# Altium footprint library ICs And Semiconductors THD.PcbLib: 507 footprints (part 15 of 32)
Each footprint in its own frame and in the unit in brackets; x right, y up, seen from the top. Pads: shape width x height; smd on the part's side, far side on the other; paste and mask are expansions set on the pad; w line width, h text height; cw(c..) or ccw(c..) is an arc to the next point about the centre after c.
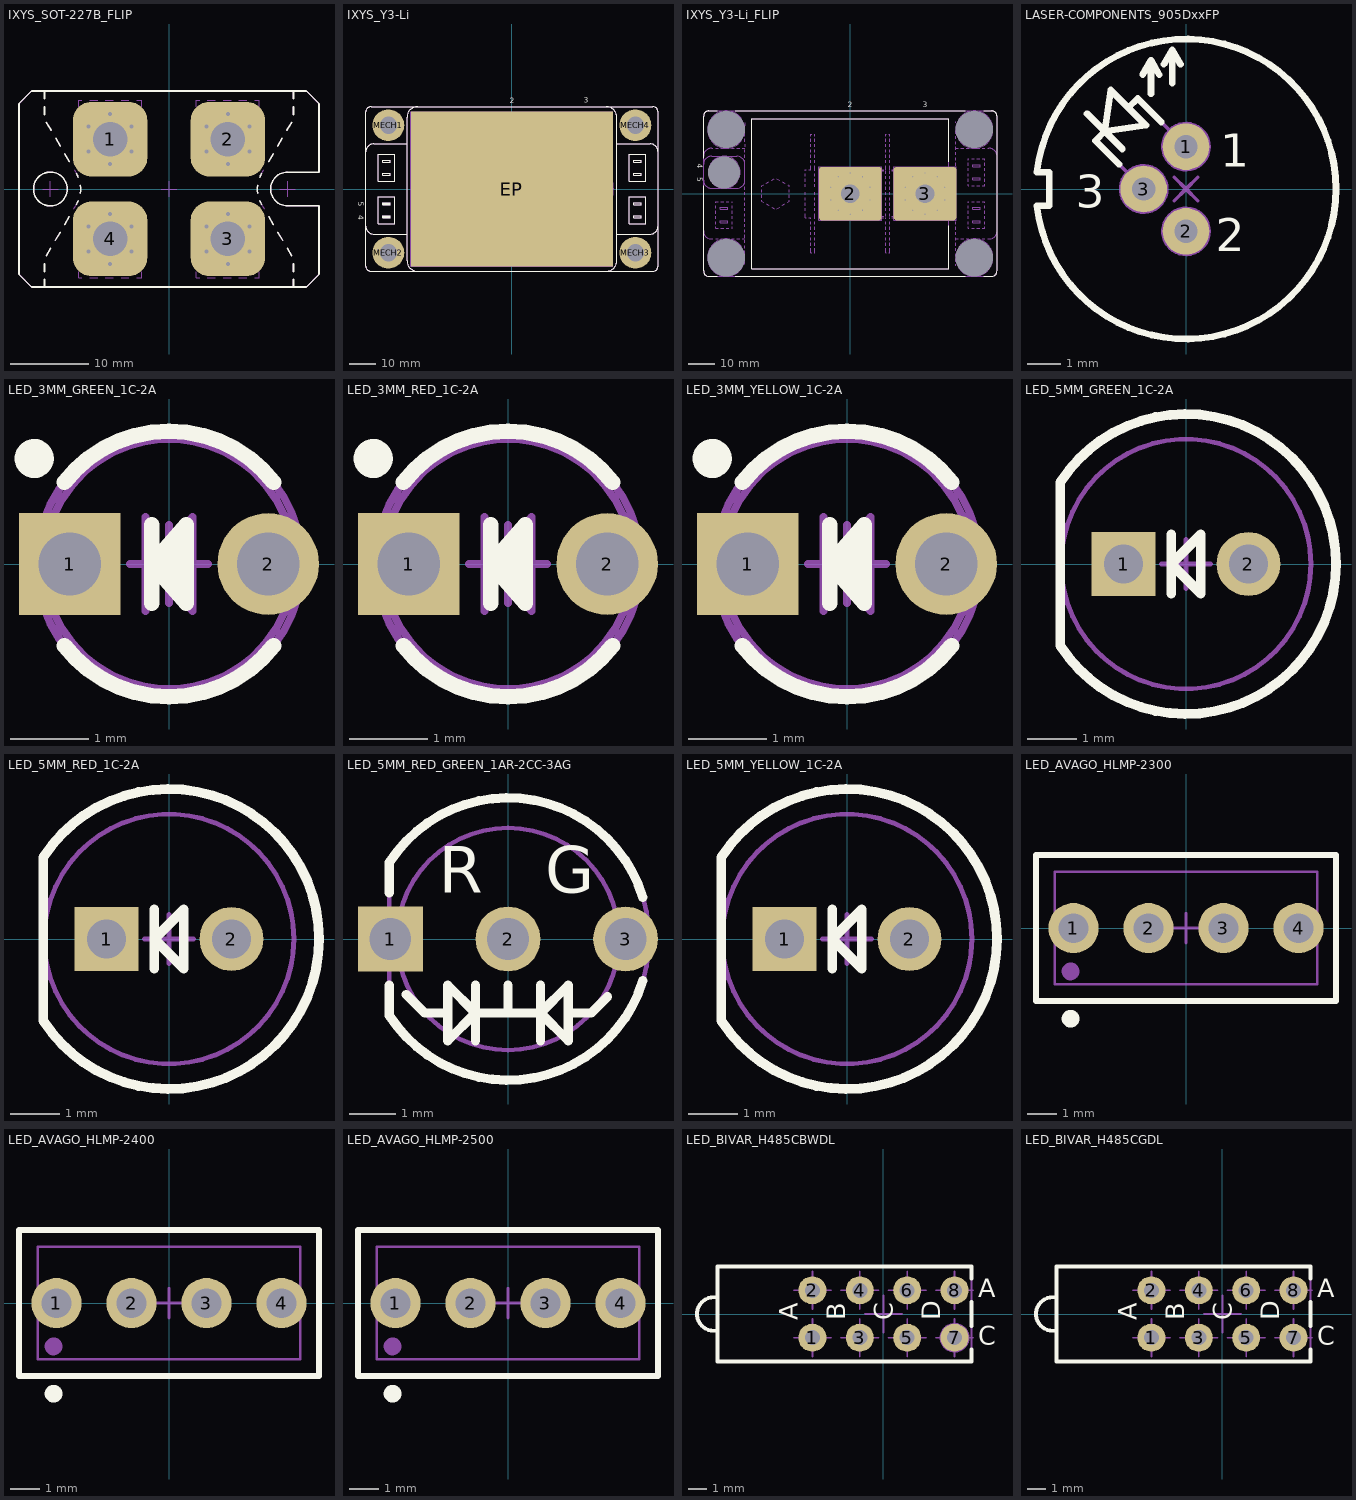
[diagram p14: the footprints below, top view; thin cyan lines are the x and y axes]

## IXYS_SOT-227B_FLIP [mm] "IXYS SOT-227B (Minibloc) Case, Body 38.01mm x 25.42mm, Screws on PCB Version"
height 12.22
pads (4):
  rrect50% 9.5x9.5 hole 4.4: 1(-7.5,6.35) 2(7.5,6.35) 3(7.5,-6.35) 4(-7.5,-6.35)
via 10.25,4.763 diameter 1 hole 0.5
via 7.5,3.175 diameter 1 hole 0.5
via 4.75,4.763 diameter 1 hole 0.5
via 4.75,7.938 diameter 1 hole 0.5
via 7.5,9.525 diameter 1 hole 0.5
via 10.25,7.938 diameter 1 hole 0.5
via -4.75,4.763 diameter 1 hole 0.5
via -7.5,3.175 diameter 1 hole 0.5
via -10.25,4.763 diameter 1 hole 0.5
via -10.25,7.938 diameter 1 hole 0.5
via -7.5,9.525 diameter 1 hole 0.5
via -4.75,7.938 diameter 1 hole 0.5
via 10.25,-7.938 diameter 1 hole 0.5
via 7.5,-9.525 diameter 1 hole 0.5
via 4.75,-7.938 diameter 1 hole 0.5
via 4.75,-4.763 diameter 1 hole 0.5
via 7.5,-3.175 diameter 1 hole 0.5
via 10.25,-4.763 diameter 1 hole 0.5
via -4.75,-7.938 diameter 1 hole 0.5
via -7.5,-9.525 diameter 1 hole 0.5
via -10.25,-7.938 diameter 1 hole 0.5
via -10.25,-4.763 diameter 1 hole 0.5
via -7.5,-3.175 diameter 1 hole 0.5
via -4.75,-4.763 diameter 1 hole 0.5
Top Overlay:
  circle w0.2: c-15.1,0 r2.15
  lines w0.2: -15.85,-11.521 -15.85,-12.479 ; -15.85,-10.521 -15.85,-9.521 ; -15.85,9.479 -15.85,10.479 ; -15.85,11.479 -15.85,12.479 ; -15.628,-8.521 -15.043,-7.521 ; -15.603,8.479 -15.018,7.479 ; -14.457,-6.521 -13.871,-5.521 ; -14.432,6.479 -13.847,5.479 ; -13.286,-4.521 -12.7,-3.521 ; -13.261,4.479 -12.676,3.479 ; -11.778,-1.945 ccw(c-15.1,0) -11.563,-1.521 ; -11.778,1.945 cw(c-15.1,0) -11.545,1.479 ; -11.285,-0.521 ccw(c-15.1,0) -11.28,0.479 ; 11.28,0.479 ccw(c15.1,0) 11.285,-0.521 ; 11.545,1.479 cw(c15.1,0) 11.778,1.945 ; 11.563,-1.521 ccw(c15.1,0) 11.778,-1.945 ; 12.676,3.479 13.261,4.479 ; 12.7,-3.521 13.286,-4.521 ; 13.847,5.479 14.432,6.479 ; 13.871,-5.521 14.457,-6.521 ; 15.018,7.479 15.603,8.479 ; 15.043,-7.521 15.628,-8.521 ; 15.85,-11.521 15.85,-12.479 ; 15.85,-10.521 15.85,-9.521 ; 15.85,9.479 15.85,10.479 ; 15.85,11.479 15.85,12.479 ; -15.85,-12.479 15.85,-12.479 ; -15.85,-12.479 -17.5,-12.479 -19.1,-10.879 -19.1,10.879 -17.5,12.479 -15.85,12.479 ; -15.85,12.479 15.85,12.479 ; 15.1,-2.15 cw(c15.1,0) 15.1,2.15 ; 15.1,-2.15 19.1,-2.15 ; 15.1,-2.15 19.1,-2.15 ; 15.1,2.15 19.1,2.15 ; 15.1,2.15 19.1,2.15 ; 15.85,-12.479 17.5,-12.479 19.1,-10.879 19.1,-2.15 ; 15.85,12.479 17.5,12.479 19.1,10.879 19.1,2.15
Notvisible:
  lines w0.1: -15.1,0 -16.1,0 -15.1,0 ; -15.1,0 -14.1,0 -15.1,0 ; -15.1,0 -15.1,1 -15.1,0 ; -15.1,0 -15.1,-1 -15.1,0 ; -7.5,-6.35 -8.5,-6.35 -7.5,-6.35 ; -7.5,-6.35 -6.5,-6.35 -7.5,-6.35 ; -7.5,-6.35 -7.5,-5.35 -7.5,-6.35 ; -7.5,-6.35 -7.5,-7.35 -7.5,-6.35 ; -7.5,6.35 -8.5,6.35 -7.5,6.35 ; -7.5,6.35 -6.5,6.35 -7.5,6.35 ; -7.5,6.35 -7.5,7.35 -7.5,6.35 ; -7.5,6.35 -7.5,5.35 -7.5,6.35 ; 0,0 -1,0 0,0 ; 0,0 1,0 0,0 ; 0,0 0,1 0,0 ; 0,0 0,-1 0,0 ; 7.5,-6.35 6.5,-6.35 7.5,-6.35 ; 7.5,-6.35 8.5,-6.35 7.5,-6.35 ; 7.5,-6.35 7.5,-5.35 7.5,-6.35 ; 7.5,-6.35 7.5,-7.35 7.5,-6.35 ; 7.5,6.35 6.5,6.35 7.5,6.35 ; 7.5,6.35 8.5,6.35 7.5,6.35 ; 7.5,6.35 7.5,7.35 7.5,6.35 ; 7.5,6.35 7.5,5.35 7.5,6.35 ; 15.1,0 14.1,0 15.1,0 ; 15.1,0 16.1,0 15.1,0 ; 15.1,0 15.1,1 15.1,0 ; 15.1,0 15.1,-1 15.1,0
Mechanical 14:
  circle w0.1: c-7.5,6.35 r2.2
  circle w0.1: c7.5,6.35 r2.2
  circle w0.1: c7.5,-6.35 r2.2
  circle w0.1: c-7.5,-6.35 r2.2
  circle w0.1: c-15.1,0 r2.15
  lines w0.1: -15.85,-11.521 -15.85,-12.479 ; -15.85,-10.521 -15.85,-9.521 ; -15.85,9.479 -15.85,10.479 ; -15.85,11.479 -15.85,12.479 ; -15.628,-8.521 -15.043,-7.521 ; -15.603,8.479 -15.018,7.479 ; -14.457,-6.521 -13.871,-5.521 ; -14.432,6.479 -13.847,5.479 ; -13.286,-4.521 -12.7,-3.521 ; -13.261,4.479 -12.676,3.479 ; -12.115,-2.521 -11.778,-1.945 ccw(c-15.1,0) -11.563,-1.521 ; -12.09,2.479 -11.778,1.945 cw(c-15.1,0) -11.545,1.479 ; -11.5,-10.521 -11.5,-11.314 -11.1,-11.314 ; -11.5,-9.521 -11.5,-8.521 ; -11.5,-7.521 -11.5,-6.521 ; -11.5,-5.521 -11.5,-4.521 ; -11.5,-3.521 -11.5,-3.342 ; -11.5,3.479 -11.5,3.342 -10.637,2.479 ; -11.5,4.479 -11.5,5.479 ; -11.5,6.479 -11.5,7.479 ; -11.5,8.479 -11.5,9.479 ; -11.5,10.479 -11.5,11.314 -11.1,11.314 ; -11.285,-0.521 ccw(c-15.1,0) -11.28,0.479 ; -10.1,-11.314 -9.1,-11.314 ; -10.1,11.314 -9.1,11.314 ; -10,1.842 -9.1,1.842 ; -8.1,-11.314 -7.1,-11.314 ; -8.1,1.842 -7.1,1.842 ; -8.1,11.314 -7.1,11.314 ; -6.1,-11.314 -5.1,-11.314 ; -6.1,1.842 -5.1,1.842 ; -6.1,11.314 -5.1,11.314 ; -5.1,-1.842 -6.1,-1.842 -5,-1.842 ; -4.363,2.479 -3.5,3.342 -3.5,3.479 ; -4.1,-11.314 -3.5,-11.314 -3.5,-10.521 ; -4.1,11.314 -3.5,11.314 -3.5,10.479 ; -3.5,-9.521 -3.5,-8.521 ; -3.5,-7.521 -3.5,-6.521 ; -3.5,-5.521 -3.5,-4.521 ; -3.5,-3.521 -3.5,-3.342 ; -3.5,4.479 -3.5,5.479 ; -3.5,6.479 -3.5,7.479 ; -3.5,8.479 -3.5,9.479 ; 3.5,-10.521 3.5,-11.314 3.9,-11.314 ; 3.5,-9.521 3.5,-8.521 ; 3.5,-7.521 3.5,-6.521 ; 3.5,-5.521 3.5,-4.521 ; 3.5,-3.521 3.5,-3.342 4.321,-2.521 ; 3.5,3.479 3.5,3.342 4.363,2.479 ; 3.5,4.479 3.5,5.479 ; 3.5,6.479 3.5,7.479 ; 3.5,8.479 3.5,9.479 ; 3.5,10.479 3.5,11.314 3.9,11.314 ; 4.9,-11.314 5.9,-11.314 ; 4.9,11.314 5.9,11.314 ; 5,-1.842 5.9,-1.842 ; 5,1.842 5.9,1.842 ; 6.9,-11.314 7.9,-11.314 ; 6.9,-1.842 7.9,-1.842 ; 6.9,1.842 7.9,1.842 ; 6.9,11.314 7.9,11.314 ; 8.9,-11.314 9.9,-11.314 ; 8.9,-1.842 9.9,-1.842 ; 8.9,1.842 9.9,1.842 ; 8.9,11.314 9.9,11.314 ; 10.637,2.479 11.5,3.342 11.5,3.479 ; 10.679,-2.521 11.5,-3.342 11.5,-3.521 ; 10.9,-11.314 11.5,-11.314 11.5,-10.521 ; 10.9,11.314 11.5,11.314 11.5,10.479 ; 11.28,0.479 ccw(c15.1,0) 11.285,-0.521 ; 11.5,-9.521 11.5,-8.521 ; 11.5,-7.521 11.5,-6.521 ; 11.5,-5.521 11.5,-4.521 ; 11.5,4.479 11.5,5.479 ; 11.5,6.479 11.5,7.479 ; 11.5,8.479 11.5,9.479 ; 11.545,1.479 cw(c15.1,0) 11.778,1.945 12.09,2.479 ; 11.563,-1.521 ccw(c15.1,0) 11.778,-1.945 12.115,-2.521 ; 12.676,3.479 13.261,4.479 ; 12.7,-3.521 13.286,-4.521 ; 13.847,5.479 14.432,6.479 ; 13.871,-5.521 14.457,-6.521 ; 15.018,7.479 15.603,8.479 ; 15.043,-7.521 15.628,-8.521 ; 15.85,-11.521 15.85,-12.479 ; 15.85,-10.521 15.85,-9.521 ; 15.85,9.479 15.85,10.479 ; 15.85,11.479 15.85,12.479 ; -15.85,-12.479 -17.5,-12.479 -19.1,-10.879 -19.1,10.879 -17.5,12.479 -15.85,12.479 ; -15.85,-12.479 15.85,-12.479 ; -15.85,12.479 15.85,12.479 ; -11.5,-3.342 -10.679,-2.521 -11.5,-3.342 ; -3.5,-3.342 -4.321,-2.521 -3.5,-3.342 ; 15.1,-2.15 cw(c15.1,0) 15.1,2.15 ; 15.1,-2.15 19.1,-2.15 ; 15.1,-2.15 19.1,-2.15 ; 15.1,2.15 19.1,2.15 ; 15.1,2.15 19.1,2.15 ; 15.85,-12.479 17.5,-12.479 19.1,-10.879 19.1,-2.15 ; 15.85,12.479 17.5,12.479 19.1,10.879 19.1,2.15 ; -10,-1.842 -9.1,-1.842 -10,-1.842 ; -8.1,-1.842 -7.1,-1.842 -8.1,-1.842
3D body "IXYS_SOT-227B_FLIP_Part2.stp": height 10.24, standoff -4.69, extent -11.5,-10.365 11.5,10.365
3D body "IXYS_SOT-227B_FLIP.stp": height 12.02, standoff -4.69, extent -19.05,-12.625 19.05,12.625

## IXYS_Y3-Li [mm] "IXYS Y3-Li Case, Body 110mm x 62mm, Screws on PCB Version"
height 31
pads (5):
  rect 76x58.2 smd: EP(0,0)
  round 12 hole 6.5: MECH1(-46.5,24) MECH2(-46.5,-24) MECH3(46.5,-24) MECH4(46.5,24)
Top Overlay:
  lines w0.2: -55,-14 ccw(c-52,-14) -52,-17 -39.5,-17 ; -55,14 cw(c-52,14) -52,17 -39.5,17 ; -48.65,-10.8 -45.85,-10.8 ; -48.65,-10.7 -45.85,-10.7 ; -48.65,-10.6 -45.85,-10.6 ; -48.65,-10.5 -45.85,-10.5 ; -48.65,-10.4 -45.85,-10.4 ; -48.65,-10.3 -45.85,-10.3 ; -48.65,-10.2 -45.85,-10.2 ; -48.65,-5.8 -45.85,-5.8 ; -48.65,-5.7 -45.85,-5.7 ; -48.65,-5.6 -45.85,-5.6 ; -48.65,-5.5 -45.85,-5.5 ; -48.65,-5.4 -45.85,-5.4 ; -48.65,-5.3 -45.85,-5.3 ; -48.65,-5.2 -45.85,-5.2 ; -35.5,-31 cw(c-35.5,-27) -39.5,-27 -39.5,27 cw(c-35.5,27) -35.5,31 ; 35.5,-31 ccw(c35.5,-27) 39.5,-27 39.5,27 ccw(c35.5,27) 35.5,31 ; 39.5,-17 52,-17 ccw(c52,-14) 55,-14 ; 39.5,17 52,17 cw(c52,14) 55,14 ; -55,-29 ccw(c-53,-29) -53,-31 53,-31 ccw(c53,-29) 55,-29 55,29 ccw(c53,29) 53,31 -53,31 ccw(c-53,29) -55,29 -55,-29 ; -50.35,-13 -50.35,-3 -44.15,-3 -44.15,-13 -50.35,-13 ; -50.35,3 -44.15,3 -44.15,13 -50.35,13 -50.35,3 ; -48.65,-10.9 -48.65,-10.1 -45.85,-10.1 -45.85,-10.9 -48.65,-10.9 ; -48.65,-5.9 -48.65,-5.1 -45.85,-5.1 -45.85,-5.9 -48.65,-5.9 ; -48.65,5.1 -48.65,5.9 -45.85,5.9 -45.85,5.1 -48.65,5.1 ; -48.65,10.1 -48.65,10.9 -45.85,10.9 -45.85,10.1 -48.65,10.1 ; 44.15,-13 50.35,-13 50.35,-3 44.15,-3 44.15,-13 ; 44.15,3 50.35,3 50.35,13 44.15,13 44.15,3 ; 45.85,-10.9 48.65,-10.9 48.65,-10.1 45.85,-10.1 45.85,-10.9 ; 45.85,-5.9 48.65,-5.9 48.65,-5.1 45.85,-5.1 45.85,-5.9 ; 45.85,5.1 48.65,5.1 48.65,5.9 45.85,5.9 45.85,5.1 ; 45.85,10.1 48.65,10.1 48.65,10.9 45.85,10.9 45.85,10.1
  text "4" at -57.95,-9.846 h2
  text "3" at 27.096,32.45 h2
  text "2" at -0.904,32.35 h2
  text "5" at -57.95,-4.846 h2
Notvisible:
  lines w0.1: -47.75,-10.5 -47.25,-10.5 ; -47.75,-5.5 -47.25,-5.5 ; -47.25,-11 -47.25,-10.5 ; -47.25,-10 -47.25,-10.5 ; -47.25,-6 -47.25,-5.5 ; -47.25,-5 -47.25,-5.5 ; -47,-24 -46.5,-24 ; -47,24 -46.5,24 ; -46.75,-10.5 -47.25,-10.5 ; -46.75,-5.5 -47.25,-5.5 ; -46.5,-24.5 -46.5,-24 ; -46.5,-23.5 -46.5,-24 ; -46.5,23.5 -46.5,24 ; -46.5,24.5 -46.5,24 ; -46,-24 -46.5,-24 ; -46,24 -46.5,24 ; -0.5,0 0,0 ; 0,-0.5 0,0 ; 0,0.5 0,0 ; 0.5,0 0,0 ; 27.5,0 28,0 ; 28,-0.5 28,0 ; 28,0.5 28,0 ; 28.5,0 28,0 ; 46,-24 46.5,-24 ; 46,24 46.5,24 ; 46.5,-24.5 46.5,-24 ; 46.5,-23.5 46.5,-24 ; 46.5,23.5 46.5,24 ; 46.5,24.5 46.5,24 ; 47,-24 46.5,-24 ; 47,24 46.5,24 ; -38,-29.1 -38,29.1 38,29.1 38,-29.1 -38,-29.1
Mechanical 14:
  circle w0.1: c-28,0 r3
  circle w0.1: c46.5,-24 r3.25
  circle w0.1: c46.5,24 r3.25
  circle w0.1: c-46.5,24 r3.25
  circle w0.1: c-46.5,-24 r3.288
  lines w0.1: -55,-14 ccw(c-52,-14) -52,-17 -39.5,-17 ; -55,14 cw(c-52,14) -52,17 -39.5,17 ; -48.65,-10.8 -45.85,-10.8 ; -48.65,-10.7 -45.85,-10.7 ; -48.65,-10.6 -45.85,-10.6 ; -48.65,-10.5 -45.85,-10.5 ; -48.65,-10.4 -45.85,-10.4 ; -48.65,-10.3 -45.85,-10.3 ; -48.65,-10.2 -45.85,-10.2 ; -48.65,-5.8 -45.85,-5.8 ; -48.65,-5.7 -45.85,-5.7 ; -48.65,-5.6 -45.85,-5.6 ; -48.65,-5.5 -45.85,-5.5 ; -48.65,-5.4 -45.85,-5.4 ; -48.65,-5.3 -45.85,-5.3 ; -48.65,-5.2 -45.85,-5.2 ; -35.5,-31 cw(c-35.5,-27) -39.5,-27 -39.5,27 cw(c-35.5,27) -35.5,31 ; 11.1,-8.5 11.1,-9 13.25,-9 13.25,-22.25 14.75,-22.25 14.75,-9 16.9,-9 16.9,-8.5 ; 11.1,8.5 11.1,9 13.25,9 13.25,22.25 14.75,22.25 14.75,9 16.9,9 16.9,8.5 ; 35.5,-31 ccw(c35.5,-27) 39.5,-27 39.5,27 ccw(c35.5,27) 35.5,31 ; 39.5,-17 52,-17 ccw(c52,-14) 55,-14 ; 39.5,17 52,17 cw(c52,14) 55,14 ; -55,-29 ccw(c-53,-29) -53,-31 53,-31 ccw(c53,-29) 55,-29 55,29 ccw(c53,29) 53,31 -53,31 ccw(c-53,29) -55,29 -55,-29 ; -50.35,-13 -50.35,-3 -44.15,-3 -44.15,-13 -50.35,-13 ; -50.35,3 -44.15,3 -44.15,13 -50.35,13 -50.35,3 ; -48.65,-10.9 -48.65,-10.1 -45.85,-10.1 -45.85,-10.9 -48.65,-10.9 ; -48.65,-5.9 -48.65,-5.1 -45.85,-5.1 -45.85,-5.9 -48.65,-5.9 ; -48.65,5.1 -48.65,5.9 -45.85,5.9 -45.85,5.1 -48.65,5.1 ; -48.65,10.1 -48.65,10.9 -45.85,10.9 -45.85,10.1 -48.65,10.1 ; -33.1,-2.944 -33.1,2.944 -28,5.889 -22.9,2.944 -22.9,-2.944 -28,-5.889 -33.1,-2.944 ; -16.9,-9 -14.75,-9 -14.75,-22.25 -13.25,-22.25 -13.25,22.25 -14.75,22.25 -14.75,9 -16.9,9 -16.9,-9 ; -8.25,-8.5 cw(c8.813,0) -8.25,8.5 13.25,8.5 13.25,-8.5 -8.25,-8.5 ; -0.5,-3.25 cw(c-0.5,0) -0.5,3.25 0.5,3.25 cw(c0.5,0) 0.5,-3.25 -0.5,-3.25 ; 14.75,-8.5 14.75,8.5 36.25,8.5 cw(c19.188,0) 36.25,-8.5 14.75,-8.5 ; 27.5,-3.25 cw(c27.5,0) 27.5,3.25 28.5,3.25 cw(c28.5,0) 28.5,-3.25 27.5,-3.25 ; 44.15,-13 50.35,-13 50.35,-3 44.15,-3 44.15,-13 ; 44.15,3 50.35,3 50.35,13 44.15,13 44.15,3 ; 45.85,-10.9 48.65,-10.9 48.65,-10.1 45.85,-10.1 45.85,-10.9 ; 45.85,-5.9 48.65,-5.9 48.65,-5.1 45.85,-5.1 45.85,-5.9 ; 45.85,5.1 48.65,5.1 48.65,5.9 45.85,5.9 45.85,5.1 ; 45.85,10.1 48.65,10.1 48.65,10.9 45.85,10.9 45.85,10.1
  text "4" at -57.95,-9.846 h2
  text "5" at -57.95,-4.846 h2
3D body "IXYS_Y3-Li.stp": height 31, standoff 0, extent -55,-31 55,31

## IXYS_Y3-Li_FLIP [mm] "IXYS Y3-Li Case, Body 110mm x 62mm"
height 31
pads (7):
  rrect10% 23.5x20 hole 7: 2(0,0) 3(28,0)
  round 1 hole 14 unplated mask+6.5: MECH1(-46.5,24) MECH2(-46.5,-24) MECH3(46.5,-24) MECH4(46.5,24)
  round 1 hole 12 unplated mask+5.5: MECH5(-47.25,8)
via 4.555,6.27 diameter 1 hole 0.5
via 7.371,2.395 diameter 1 hole 0.5
via 7.371,-2.395 diameter 1 hole 0.5
via 4.555,-6.27 diameter 1 hole 0.5
via -4.555,-6.27 diameter 1 hole 0.5
via -7.371,-2.395 diameter 1 hole 0.5
via -7.371,2.395 diameter 1 hole 0.5
via -4.555,6.27 diameter 1 hole 0.5
via 0,7.75 diameter 1 hole 0.5
via 0,-7.75 diameter 1 hole 0.5
via 23.445,6.27 diameter 1 hole 0.5
via 28,7.75 diameter 1 hole 0.5
via 32.555,6.27 diameter 1 hole 0.5
via 35.371,2.395 diameter 1 hole 0.5
via 35.371,-2.395 diameter 1 hole 0.5
via 32.555,-6.27 diameter 1 hole 0.5
via 28,-7.75 diameter 1 hole 0.5
via 23.445,-6.27 diameter 1 hole 0.5
via 20.629,-2.395 diameter 1 hole 0.5
via 20.629,2.395 diameter 1 hole 0.5
Top Overlay:
  lines w0.2: -55,3 -55,-29 ccw(c-53,-29) -53,-31 -49.941,-31 ; -55,13.332 -55,29 cw(c-53,29) -53,31 -49.941,31 ; -43.059,-31 43.059,-31 ; -43.059,31 43.059,31 ; 37,-12 37,-28.1 -37,-28.1 -37,28.1 37,28.1 37,12 ; 49.941,-31 53,-31 ccw(c53,-29) 55,-29 55,29 ccw(c53,29) 53,31 49.941,31
  text "2" at -0.904,32.35 h2
  text "3" at 27.096,32.45 h2
  text "4" at -57.45,11.154 h2
  text "5" at -57.45,6.154 h2
Notvisible:
  circle w0.1: c-46.5,24 r7
  circle w0.1: c-47.25,8 r6
  circle w0.1: c46.5,-24 r7
  circle w0.1: c-46.5,-24 r7
  circle w0.1: c46.5,24 r7
  circle w0.1: c28,0 r7.75
  circle w0.1: c0,0 r7.75
  circle w0.1: c28,0 r3.5
  circle w0.1: c0,0 r3.5
  lines w0.1: -47.75,5.5 -47.25,5.5 ; -47.75,8 -47.25,8 ; -47.75,10.5 -47.25,10.5 ; -47.25,5 -47.25,5.5 ; -47.25,6 -47.25,5.5 ; -47.25,7.5 -47.25,8 ; -47.25,8.5 -47.25,8 ; -47.25,10 -47.25,10.5 ; -47.25,11 -47.25,10.5 ; -47,-24 -46.5,-24 ; -47,24 -46.5,24 ; -46.75,5.5 -47.25,5.5 ; -46.75,8 -47.25,8 ; -46.75,10.5 -47.25,10.5 ; -46.5,-24.5 -46.5,-24 ; -46.5,-23.5 -46.5,-24 ; -46.5,23.5 -46.5,24 ; -46.5,24.5 -46.5,24 ; -46,-24 -46.5,-24 ; -46,24 -46.5,24 ; -39.5,4.5 -39.5,11 ccw(c-42.5,11) -42.5,14 -52,14 ccw(c-52,11) -55,11 -55,5 ccw(c-52,5) -52,2 -42.5,2 ccw(c-42.5,5) -39.5,5 ; -7.371,-2.395 0,0 ; -7.371,2.395 0,0 ; -4.555,-6.27 0,0 ; -4.555,6.27 0,0 ; -0.354,-0.354 0,0 ; -0.354,0.354 0,0 ; 0,-7.75 0,0 ; 0,7.75 0,0 ; 0.354,-0.354 0,0 ; 0.354,0.354 0,0 ; 4.555,-6.27 0,0 ; 4.555,6.27 0,0 ; 7.371,-2.395 0,0 ; 7.371,2.395 0,0 ; 20.629,-2.395 28,0 ; 20.629,2.395 28,0 ; 23.445,-6.27 28,0 ; 23.445,6.27 28,0 ; 27.646,-0.354 28,0 ; 27.646,0.354 28,0 ; 28,-7.75 28,0 ; 28,7.75 28,0 ; 28.354,-0.354 28,0 ; 28.354,0.354 28,0 ; 32.555,-6.27 28,0 ; 32.555,6.27 28,0 ; 35.371,-2.395 28,0 ; 35.371,2.395 28,0 ; 46,-24 46.5,-24 ; 46,24 46.5,24 ; 46.5,-24.5 46.5,-24 ; 46.5,-23.5 46.5,-24 ; 46.5,23.5 46.5,24 ; 46.5,24.5 46.5,24 ; 47,-24 46.5,-24 ; 47,24 46.5,24 ; -11.75,-10 11.75,-10 11.75,10 -11.75,10 -11.75,-10 ; 16.25,-10 16.25,10 39.75,10 39.75,-10 16.25,-10
Mechanical 14:
  drawing of 385 lines, arcs and shapes, not listed
  text "4" at -57.45,11.154 h2
  text "5" at -57.45,6.154 h2
3D body "IXYS_Y3-Li_FLIP.stp": height 31, standoff 0, extent -55,-31 55,31

## LASER-COMPONENTS_905DxxFP [mm] "905nm Fiber Pigtailed Pulsed Laser Diode 905 XX FP-Series"
height 36
pads (3):
  round 1.4 hole 0.7: 1(0,1.27) 2(0,-1.27) 3(-1.27,0)
Top Overlay:
  lines w0.2: -2.968,2.261 -1.908,1.201 ; -2.012,0.742 -2.72,1.45 -2.438,1.731 ; -1.731,2.438 -1.45,2.72 -0.742,2.012 ; -1.3,3.427 -1.05,3.86 ; -1.05,2.86 -1.05,3.86 ; -0.8,3.427 -1.05,3.86 ; -0.664,3.738 -0.414,4.171 ; -0.414,3.171 -0.414,4.171 ; -0.164,3.738 -0.414,4.171 ; -2.438,1.731 -1.201,1.908 -2.261,2.968 -2.438,1.731 ; -4.472,-0.5 ccw(c0,0) -4.472,0.5 -4.1,0.5 -4.1,-0.5 -4.472,-0.5
  text "1" at 1.027,0.67 h1
  text "3" at -3.304,-0.568 h1
  text "2" at 0.886,-1.87 h1
Notvisible:
  circle w0.1: c0,1.27 r0.7
  circle w0.1: c0,1.27 r0.35
  circle w0.1: c-1.27,0 r0.7
  circle w0.1: c-1.27,0 r0.35
  circle w0.1: c0,-1.27 r0.7
  circle w0.1: c0,-1.27 r0.35
  lines w0.1: -1.77,0 -1.27,0 ; -1.27,-0.5 -1.27,0 ; -1.27,0.5 -1.27,0 ; -0.77,0 -1.27,0 ; -0.5,-1.27 0,-1.27 ; -0.5,1.27 0,1.27 ; -0.354,-0.354 0,0 ; -0.354,0.354 0,0 ; 0,-1.77 0,-1.27 ; 0,-0.77 0,-1.27 ; 0,0.77 0,1.27 ; 0,1.77 0,1.27 ; 0.354,-0.354 0,0 ; 0.354,0.354 0,0 ; 0.5,-1.27 0,-1.27 ; 0.5,1.27 0,1.27
Mechanical 14:
  lines w0.1: -2.968,2.261 -1.908,1.201 ; -1.731,2.438 -1.45,2.72 0,1.27 ; -1.3,3.427 -1.05,3.86 ; -1.27,0 -2.72,1.45 -2.438,1.731 ; -1.05,2.86 -1.05,3.86 ; -0.8,3.427 -1.05,3.86 ; -0.664,3.738 -0.414,4.171 ; -0.414,3.171 -0.414,4.171 ; -0.164,3.738 -0.414,4.171 ; -2.438,1.731 -1.201,1.908 -2.261,2.968 -2.438,1.731 ; -4.472,-0.5 ccw(c0,0) -4.472,0.5 -4.1,0.5 -4.1,-0.5 -4.472,-0.5
  text "1" at 1.027,0.67 h1
  text "3" at -3.304,-0.568 h1
  text "2" at 0.886,-1.87 h1
3D body "LASER-COMPONENTS_905DxxFP.stp": height 41, standoff -3.8, extent -4.472,-4.495 4.5,4.495

## LED_3MM_GREEN_1C-2A [mm] "LED, Green, Body Dia. 3.43 mm, Pin spacing 2.54mm"
height 6.35
pads (2):
  rect 1.3x1.3 hole 0.8: 1(-1.27,0)
  round 1.3 hole 0.8: 2(1.27,0)
Top Overlay:
  circle w0.25: c-1.725,1.35 r0.125
  lines w0.2: -1.339,-1.048 ccw(c0,0) 1.339,-1.048 ; -1.339,1.048 cw(c0,0) 1.339,1.048 ; -0.22,-0.5 -0.22,0.5 ; 0.22,-0.4 -0.22,0 ; 0.22,-0.3 -0.22,0 ; 0.22,-0.2 -0.22,0 ; 0.22,-0.1 -0.22,0 ; 0.22,0 -0.22,0 ; 0.22,0.1 -0.22,0 ; 0.22,0.2 -0.22,0 ; 0.22,0.3 -0.22,0 ; 0.22,0.4 -0.22,0 ; -0.22,0 0.22,0.5 0.22,-0.5 -0.22,0
Notvisible:
  lines w0.1: -1.77,0 -1.27,0 ; -1.27,-0.5 -1.27,0 ; -1.27,0.5 -1.27,0 ; -0.77,0 -1.27,0 ; -0.5,0 0,0 ; 0,-0.5 0,0 ; 0,0.5 0,0 ; 0.5,0 0,0 ; 0.77,0 1.27,0 ; 1.27,-0.5 1.27,0 ; 1.27,0.5 1.27,0 ; 1.77,0 1.27,0
Mechanical 14:
  circle w0.1: c0,0 r1.7
  circle w0.1: c0,0 r1.6
  lines w0.1: -0.3,-0.6 -0.3,0.6 ; 0.3,0 -0.3,0 ; -0.3,0 0.3,0.6 0.3,-0.6 -0.3,0
3D body "LED_3MM_GREEN_v.stp": height 9.85, standoff -3.5, extent -1.715,-1.715 1.715,1.715

## LED_3MM_RED_1C-2A [mm] "LED, Red, Body Dia. 3.43 mm, Pin spacing 2.54mm"
height 6.35
pads (2):
  rect 1.3x1.3 hole 0.8: 1(-1.27,0)
  round 1.3 hole 0.8: 2(1.27,0)
Top Overlay:
  circle w0.25: c-1.725,1.35 r0.125
  lines w0.2: -1.339,-1.048 ccw(c0,0) 1.339,-1.048 ; -1.339,1.048 cw(c0,0) 1.339,1.048 ; -0.22,-0.5 -0.22,0.5 ; 0.22,-0.4 -0.22,0 ; 0.22,-0.3 -0.22,0 ; 0.22,-0.2 -0.22,0 ; 0.22,-0.1 -0.22,0 ; 0.22,0 -0.22,0 ; 0.22,0.1 -0.22,0 ; 0.22,0.2 -0.22,0 ; 0.22,0.3 -0.22,0 ; 0.22,0.4 -0.22,0 ; -0.22,0 0.22,-0.5 0.22,0.5 -0.22,0
Notvisible:
  lines w0.1: -1.77,0 -1.27,0 ; -1.27,-0.5 -1.27,0 ; -1.27,0.5 -1.27,0 ; -0.77,0 -1.27,0 ; -0.5,0 0,0 ; 0,-0.5 0,0 ; 0,0.5 0,0 ; 0.5,0 0,0 ; 0.77,0 1.27,0 ; 1.27,-0.5 1.27,0 ; 1.27,0.5 1.27,0 ; 1.77,0 1.27,0
Mechanical 14:
  circle w0.1: c0,0 r1.6
  circle w0.1: c0,0 r1.7
  lines w0.1: -0.3,-0.6 -0.3,0.6 ; 0.3,0 -0.3,0 ; -0.3,0 0.3,-0.6 0.3,0.6 -0.3,0
3D body "LED_3MM_RED_v.stp": height 9.85, standoff -3.5, extent -1.715,-1.715 1.715,1.715

## LED_3MM_YELLOW_1C-2A [mm] "LED, Red, Body Dia. 3.43 mm, Pin spacing 2.54mm"
height 6.35
pads (2):
  rect 1.3x1.3 hole 0.8: 1(-1.27,0)
  round 1.3 hole 0.8: 2(1.27,0)
Top Overlay:
  circle w0.25: c-1.725,1.35 r0.125
  lines w0.2: -1.339,-1.048 ccw(c0,0) 1.339,-1.048 ; -1.339,1.048 cw(c0,0) 1.339,1.048 ; -0.22,-0.5 -0.22,0.5 ; 0.22,-0.4 -0.22,0 ; 0.22,-0.3 -0.22,0 ; 0.22,-0.2 -0.22,0 ; 0.22,-0.1 -0.22,0 ; 0.22,0 -0.22,0 ; 0.22,0.1 -0.22,0 ; 0.22,0.2 -0.22,0 ; 0.22,0.3 -0.22,0 ; 0.22,0.4 -0.22,0 ; -0.22,0 0.22,-0.5 0.22,0.5 -0.22,0
Notvisible:
  lines w0.1: -1.77,0 -1.27,0 ; -1.27,-0.5 -1.27,0 ; -1.27,0.5 -1.27,0 ; -0.77,0 -1.27,0 ; -0.5,0 0,0 ; 0,-0.5 0,0 ; 0,0.5 0,0 ; 0.5,0 0,0 ; 0.77,0 1.27,0 ; 1.27,-0.5 1.27,0 ; 1.27,0.5 1.27,0 ; 1.77,0 1.27,0
Mechanical 14:
  circle w0.1: c0,0 r1.6
  circle w0.1: c0,0 r1.7
  lines w0.1: -0.3,-0.6 -0.3,0.6 ; 0.3,0 -0.3,0 ; -0.3,0 0.3,-0.6 0.3,0.6 -0.3,0
3D body "LED_3MM_YELLOW_v.stp": height 9.85, standoff -3.5, extent -1.715,-1.715 1.715,1.715

## LED_5MM_GREEN_1C-2A [mm] "LED, Green, Body Dia. 5.08mm, Pin spacing 2.54mm"
height 9.19
pads (2):
  rect 1.3x1.3 hole 0.8: 1(-1.27,0)
  round 1.3 hole 0.8: 2(1.27,0)
Top Overlay:
  lines w0.2: -0.3,-0.6 -0.3,0.6 ; -2.558,-1.661 ccw(c0,0) -2.558,1.661 -2.558,-1.661 ; -0.3,0 0.3,-0.6 0.3,0.6 -0.3,0
Notvisible:
  lines w0.1: -0.5,0 0,0 ; 0,-0.5 0,0 ; 0,0.5 0,0 ; 0.5,0 0,0
Mechanical 14:
  circle w0.1: c0,0 r2.54
  lines w0.1: -0.3,-0.6 -0.3,0.6 ; -2.529,-1.706 ccw(c0,0) -2.529,1.706 -2.529,-1.706 ; -0.3,0 0.3,0.6 0.3,-0.6 -0.3,0
3D body "LED_5MM_GREEN_v.stp": height 14.32, standoff -3.5, extent -2.54,-3.048 3.05,3.048

## LED_5MM_RED_1C-2A [mm] "LED, Red, Body Dia. 5.08mm, Pin spacing 2.54mm"
height 9.19
pads (2):
  rect 1.3x1.3 hole 0.8: 1(-1.27,0)
  round 1.3 hole 0.8: 2(1.27,0)
Top Overlay:
  lines w0.2: -0.3,-0.6 -0.3,0.6 ; -2.558,-1.661 ccw(c0,0) -2.558,1.661 -2.558,-1.661 ; -0.3,0 0.3,-0.6 0.3,0.6 -0.3,0
Notvisible:
  lines w0.1: -0.5,0 0,0 ; 0,-0.5 0,0 ; 0,0.5 0,0 ; 0.5,0 0,0
Mechanical 14:
  circle w0.1: c0,0 r2.54
  lines w0.1: -0.3,-0.6 -0.3,0.6 ; -2.529,-1.706 ccw(c0,0) -2.529,1.706 -2.529,-1.706 ; -0.3,0 0.3,0.6 0.3,-0.6 -0.3,0
3D body "LED_5MM_RED_v.stp": height 14.32, standoff -3.5, extent -2.54,-3.048 3.05,3.048

## LED_5MM_RED_GREEN_1AR-2CC-3AG [mm] "Bicolor Red/Green  LED 1 Anode Red 2 Com Cathode 3 Anode Green, Body Dia. 5.08mm, Pin spacing 2.54mm"
height 12.4
pads (3):
  rect 1.4x1.4 hole 0.9: 1(-2.54,0)
  round 1.4 hole 0.9: 2(0,0) 3(2.54,0)
Top Overlay:
  lines w0.2: -2.563,-1 -2.563,-1.653 ccw(c0,0) 2.913,-0.904 ; -2.563,1 -2.563,1.653 cw(c0,0) 2.913,0.904 ; -2.2,-1.2 -1.8,-1.6 -1.3,-1.6 ; -0.7,-2.2 -0.7,-1 ; 0,-1.6 0,-1 ; 0.7,-2.2 0.7,-1 ; 1.3,-1.6 1.8,-1.6 2.15,-1.25 ; -0.7,-1.6 -1.3,-2.2 -1.3,-1 -0.7,-1.6 ; -0.7,-1.6 0.7,-1.6 ; 0.7,-1.6 1.3,-1 1.3,-2.2 0.7,-1.6
  text "R" at -1.5,1 h1
  text "G" at 0.8,1 h1
Mechanical 14:
  lines w0.1: -1.8,-1.6 -1.3,-1.6 ; -0.7,-2.2 -0.7,-1 ; 0,-1.6 0,-1 ; 0.7,-2.2 0.7,-1 ; 1.3,-1.6 1.8,-1.6 ; -0.7,-1.6 0.7,-1.6 ; -0.7,-1.6 -1.3,-1 -1.3,-2.2 -0.7,-1.6 ; 0.7,-1.6 1.3,-2.2 1.3,-1 0.7,-1.6 ; -2.563,-1.653 ccw(c0,0) 3.05,0 ccw(c0,0) -2.563,1.653 -2.563,0 -2.563,-1.653 ; -2.4,0 cw(c0,0) 2.4,0 cw(c0,0) -2.4,0
3D body "LED_OSRAM_LU5351-JM-1.stp": height 12.4, standoff -3.6, extent -2.94,-2.95 2.95,2.95

## LED_5MM_YELLOW_1C-2A [mm] "LED, Yellow, Body Dia. 5.08mm, Pin spacing 2.54mm"
height 9.19
pads (2):
  rect 1.3x1.3 hole 0.8: 1(-1.27,0)
  round 1.3 hole 0.8: 2(1.27,0)
Top Overlay:
  lines w0.2: -0.3,-0.6 -0.3,0.6 ; -2.558,-1.661 ccw(c0,0) -2.558,1.661 -2.558,-1.661 ; -0.3,0 0.3,0.6 0.3,-0.6 -0.3,0
Notvisible:
  lines w0.1: -0.5,0 0,0 ; 0,-0.5 0,0 ; 0,0.5 0,0 ; 0.5,0 0,0
Mechanical 14:
  circle w0.1: c0,0 r2.54
  lines w0.1: -0.3,-0.6 -0.3,0.6 ; -2.529,-1.706 ccw(c0,0) -2.529,1.706 -2.529,-1.706 ; -0.3,0 0.3,0.6 0.3,-0.6 -0.3,0
3D body "LED_5MM_YELLOW_v.stp": height 14.32, standoff -3.5, extent -2.54,-3.048 3.05,3.048

## LED_AVAGO_HLMP-2300 [mm] "10.16x 4.953mm HER LED Bar Module (2 LEDs)"
height 6.22
pads (4):
  round 1.7 hole 1: 1(-3.81,0) 2(-1.27,0) 3(1.27,0) 4(3.81,0)
Top Overlay:
  circle w0.3: c-3.91,-3.07 r0.15
  lines w0.2: -5.08,-2.477 -5.08,2.477 5.08,2.477 5.08,-2.477 -5.08,-2.477
Notvisible:
  lines w0.1: -4.31,0 -3.81,0 ; -3.81,-0.5 -3.81,0 ; -3.81,0.5 -3.81,0 ; -3.31,0 -3.81,0 ; -1.77,0 -1.27,0 ; -1.27,-0.5 -1.27,0 ; -1.27,0.5 -1.27,0 ; -0.77,0 -1.27,0 ; -0.5,0 0,0 ; 0,-0.5 0,0 ; 0,0.5 0,0 ; 0.5,0 0,0 ; 0.77,0 1.27,0 ; 1.27,-0.5 1.27,0 ; 1.27,0.5 1.27,0 ; 1.77,0 1.27,0 ; 3.31,0 3.81,0 ; 3.81,-0.5 3.81,0 ; 3.81,0.5 3.81,0 ; 4.31,0 3.81,0
Mechanical 14:
  circle w0.3: c-3.91,-1.47 r0.15
  lines w0.1: -4.445,-1.905 -4.445,1.905 ; -4.445,-1.905 4.445,-1.905 ; -4.445,-1.905 -4.445,1.905 ; -4.445,-1.905 4.445,-1.905 ; -4.445,1.905 4.445,1.905 ; -4.445,1.905 4.445,1.905 ; 4.445,-1.905 4.445,1.905 ; 4.445,-1.905 4.445,1.905 ; -5.08,-2.477 -5.08,2.477 5.08,2.477 5.08,-2.477 -5.08,-2.477
3D body "LED_AVAGO_HLMP-2300.stp": height 6.22, standoff -3.18, extent -5.08,-2.476 5.08,2.477

## LED_AVAGO_HLMP-2400 [mm] "10.16x 4.953mm Yellow LED Bar Module (2 LEDs)"
height 6.22
pads (4):
  round 1.7 hole 1: 1(-3.81,0) 2(-1.27,0) 3(1.27,0) 4(3.81,0)
Top Overlay:
  circle w0.3: c-3.91,-3.07 r0.15
  lines w0.2: -5.08,-2.477 -5.08,2.477 5.08,2.477 5.08,-2.477 -5.08,-2.477
Notvisible:
  lines w0.1: -4.31,0 -3.81,0 ; -3.81,-0.5 -3.81,0 ; -3.81,0.5 -3.81,0 ; -3.31,0 -3.81,0 ; -1.77,0 -1.27,0 ; -1.27,-0.5 -1.27,0 ; -1.27,0.5 -1.27,0 ; -0.77,0 -1.27,0 ; -0.5,0 0,0 ; 0,-0.5 0,0 ; 0,0.5 0,0 ; 0.5,0 0,0 ; 0.77,0 1.27,0 ; 1.27,-0.5 1.27,0 ; 1.27,0.5 1.27,0 ; 1.77,0 1.27,0 ; 3.31,0 3.81,0 ; 3.81,-0.5 3.81,0 ; 3.81,0.5 3.81,0 ; 4.31,0 3.81,0
Mechanical 14:
  circle w0.3: c-3.91,-1.47 r0.15
  lines w0.1: -4.445,-1.905 -4.445,1.905 ; -4.445,-1.905 4.445,-1.905 ; -4.445,-1.905 -4.445,1.905 ; -4.445,-1.905 4.445,-1.905 ; -4.445,1.905 4.445,1.905 ; -4.445,1.905 4.445,1.905 ; 4.445,-1.905 4.445,1.905 ; 4.445,-1.905 4.445,1.905 ; -5.08,-2.477 -5.08,2.477 5.08,2.477 5.08,-2.477 -5.08,-2.477
3D body "LED_AVAGO_HLMP-2400.stp": height 6.22, standoff -3.18, extent -5.08,-2.476 5.08,2.477

## LED_AVAGO_HLMP-2500 [mm] "10.16x 4.953mm Green LED Bar Module (2 LEDs)"
height 6.22
pads (4):
  round 1.7 hole 1: 1(-3.81,0) 2(-1.27,0) 3(1.27,0) 4(3.81,0)
Top Overlay:
  circle w0.3: c-3.91,-3.07 r0.15
  lines w0.2: -5.08,-2.477 5.08,-2.477 5.08,2.477 -5.08,2.477 -5.08,-2.477
Notvisible:
  lines w0.1: -4.31,0 -3.81,0 ; -3.81,-0.5 -3.81,0 ; -3.81,0.5 -3.81,0 ; -3.31,0 -3.81,0 ; -1.77,0 -1.27,0 ; -1.27,-0.5 -1.27,0 ; -1.27,0.5 -1.27,0 ; -0.77,0 -1.27,0 ; -0.5,0 0,0 ; 0,-0.5 0,0 ; 0,0.5 0,0 ; 0.5,0 0,0 ; 0.77,0 1.27,0 ; 1.27,-0.5 1.27,0 ; 1.27,0.5 1.27,0 ; 1.77,0 1.27,0 ; 3.31,0 3.81,0 ; 3.81,-0.5 3.81,0 ; 3.81,0.5 3.81,0 ; 4.31,0 3.81,0
Mechanical 14:
  circle w0.3: c-3.91,-1.47 r0.15
  lines w0.1: -4.445,-1.905 4.445,-1.905 ; -4.445,-1.905 -4.445,1.905 ; -4.445,-1.905 4.445,-1.905 ; -4.445,-1.905 -4.445,1.905 ; -4.445,1.905 4.445,1.905 ; -4.445,1.905 4.445,1.905 ; 4.445,-1.905 4.445,1.905 ; 4.445,-1.905 4.445,1.905 ; -5.08,-2.477 5.08,-2.477 5.08,2.477 -5.08,2.477 -5.08,-2.477
3D body "LED_AVAGO_HLMP-2500.stp": height 6.22, standoff -3.18, extent -5.08,-2.476 5.08,2.477

## LED_BIVAR_H485CBWDL [mm] "Quad-Level 2mm Blue LED, PCB Edge Mounting  BIVAR H485C Serie"
height 11.3
pads (8):
  round 1.5 hole 0.8: 1(-3.81,-1.27) 2(-3.81,1.27) 3(-1.27,-1.27) 4(-1.27,1.27) 5(1.27,-1.27) 6(1.27,1.27) 7(3.81,-1.27) 8(3.81,1.27)
Top Overlay:
  lines w0.2: -8.89,-0.9 -9.09,-0.9 cw(c-9.09,0) -9.09,0.9 -8.89,0.9 ; 4.71,-1.902 4.71,-2.55 -8.89,-2.55 -8.89,2.55 4.71,2.55 4.71,1.902 ; 4.71,-0.638 4.71,0.638
  text "C" at 5.08,-1.651 h1
  text "A" at 5.08,0.889 h1
  text "D" at 3.029,-0.331 h1
  text "C" at 0.489,-0.331 h1
  text "B" at -2.051,-0.331 h1
  text "A" at -4.591,-0.331 h1
Notvisible:
  circle w0.1: c3.81,-1.27 r0.75
  lines w0.1: -4.81,-1.27 -3.81,-1.27 ; -4.81,1.27 -3.81,1.27 ; -3.81,-2.27 -3.81,-1.27 ; -3.81,-0.27 -3.81,-1.27 ; -3.81,0.27 -3.81,1.27 ; -3.81,2.27 -3.81,1.27 ; -2.81,-1.27 -3.81,-1.27 ; -2.81,1.27 -3.81,1.27 ; -2.27,-1.27 -1.27,-1.27 ; -2.27,1.27 -1.27,1.27 ; -1.27,-2.27 -1.27,-1.27 ; -1.27,-0.27 -1.27,-1.27 ; -1.27,0.27 -1.27,1.27 ; -1.27,2.27 -1.27,1.27 ; -1,0 0,0 ; -0.27,-1.27 -1.27,-1.27 ; -0.27,1.27 -1.27,1.27 ; 0,-1 0,0 ; 0,1 0,0 ; 0.27,-1.27 1.27,-1.27 ; 0.27,1.27 1.27,1.27 ; 1,0 0,0 ; 1.27,-2.27 1.27,-1.27 ; 1.27,-0.27 1.27,-1.27 ; 1.27,0.27 1.27,1.27 ; 1.27,2.27 1.27,1.27 ; 2.27,-1.27 1.27,-1.27 ; 2.27,1.27 1.27,1.27 ; 2.81,-1.27 3.81,-1.27 ; 2.81,1.27 3.81,1.27 ; 3.81,-2.27 3.81,-1.27 ; 3.81,-0.27 3.81,-1.27 ; 3.81,0.27 3.81,1.27 ; 3.81,2.27 3.81,1.27 ; 4.81,-1.27 3.81,-1.27 ; 4.81,1.27 3.81,1.27
Mechanical 14:
  lines w0.1: -8.89,-0.9 -9.09,-0.9 cw(c-9.09,0) -9.09,0.9 -8.89,0.9 ; -8.89,-2.55 4.71,-2.55 4.71,2.55 -8.89,2.55 -8.89,-2.55
  text "A" at 5.08,0.889 h1
  text "C" at 5.08,-1.651 h1
  text "D" at 3.029,-0.331 h1
  text "C" at 0.489,-0.331 h1
  text "B" at -2.051,-0.331 h1
  text "A" at -4.591,-0.331 h1
3D body "LED_BIVAR_H485CBWDL.stp": height 11.3, standoff -3.2, extent -9.99,-2.55 4.71,2.55

## LED_BIVAR_H485CGDL [mm] "Quad-Level 2mm Green, PCB Edge Mounting  BIVAR H485CGDL"
height 11.3
pads (8):
  round 1.5 hole 0.8: 1(-3.81,-1.27) 2(-3.81,1.27) 3(-1.27,-1.27) 4(-1.27,1.27) 5(1.27,-1.27) 6(1.27,1.27) 7(3.81,-1.27) 8(3.81,1.27)
Top Overlay:
  lines w0.2: -8.89,-0.9 -9.09,-0.9 cw(c-9.09,0) -9.09,0.9 -8.89,0.9 ; 4.71,-1.902 4.71,-2.55 -8.89,-2.55 -8.89,2.55 4.71,2.55 4.71,1.902 ; 4.71,-0.638 4.71,0.638
  text "C" at 5.08,-1.651 h1
  text "A" at 5.08,0.889 h1
  text "A" at -4.591,-0.331 h1
  text "B" at -2.051,-0.331 h1
  text "C" at 0.489,-0.331 h1
  text "D" at 3.029,-0.331 h1
Notvisible:
  lines w0.1: -4.81,-1.27 -3.81,-1.27 ; -4.81,1.27 -3.81,1.27 ; -3.81,-2.27 -3.81,-1.27 ; -3.81,-0.27 -3.81,-1.27 ; -3.81,0.27 -3.81,1.27 ; -3.81,2.27 -3.81,1.27 ; -2.81,-1.27 -3.81,-1.27 ; -2.81,1.27 -3.81,1.27 ; -2.27,-1.27 -1.27,-1.27 ; -2.27,1.27 -1.27,1.27 ; -1.27,-2.27 -1.27,-1.27 ; -1.27,-0.27 -1.27,-1.27 ; -1.27,0.27 -1.27,1.27 ; -1.27,2.27 -1.27,1.27 ; -1,0 0,0 ; -0.27,-1.27 -1.27,-1.27 ; -0.27,1.27 -1.27,1.27 ; 0,-1 0,0 ; 0,1 0,0 ; 0.27,-1.27 1.27,-1.27 ; 0.27,1.27 1.27,1.27 ; 1,0 0,0 ; 1.27,-2.27 1.27,-1.27 ; 1.27,-0.27 1.27,-1.27 ; 1.27,0.27 1.27,1.27 ; 1.27,2.27 1.27,1.27 ; 2.27,-1.27 1.27,-1.27 ; 2.27,1.27 1.27,1.27 ; 2.81,-1.27 3.81,-1.27 ; 2.81,1.27 3.81,1.27 ; 3.81,-2.27 3.81,-1.27 ; 3.81,-0.27 3.81,-1.27 ; 3.81,0.27 3.81,1.27 ; 3.81,2.27 3.81,1.27 ; 4.81,-1.27 3.81,-1.27 ; 4.81,1.27 3.81,1.27
Mechanical 14:
  lines w0.1: -8.89,-0.9 -9.09,-0.9 cw(c-9.09,0) -9.09,0.9 -8.89,0.9 ; -8.89,-2.55 4.71,-2.55 4.71,2.55 -8.89,2.55 -8.89,-2.55
  text "A" at 5.08,0.889 h1
  text "C" at 5.08,-1.651 h1
  text "A" at -4.591,-0.331 h1
  text "B" at -2.051,-0.331 h1
  text "C" at 0.489,-0.331 h1
  text "D" at 3.029,-0.331 h1
3D body "LED_BIVAR_H485CGDL.stp": height 11.3, standoff -3.2, extent -9.99,-2.55 4.71,2.55